# Altium footprint library Molex FFC - FPC Connectors (SMT).PcbLib: 638 footprints (part 23 of 40)
Each footprint in its own frame and in the unit in brackets; x right, y up, seen from the top. Pads: shape width x height; smd on the part's side, far side on the other; paste and mask are expansions set on the pad; w line width, h text height; cw(c..) or ccw(c..) is an arc to the next point about the centre after c.
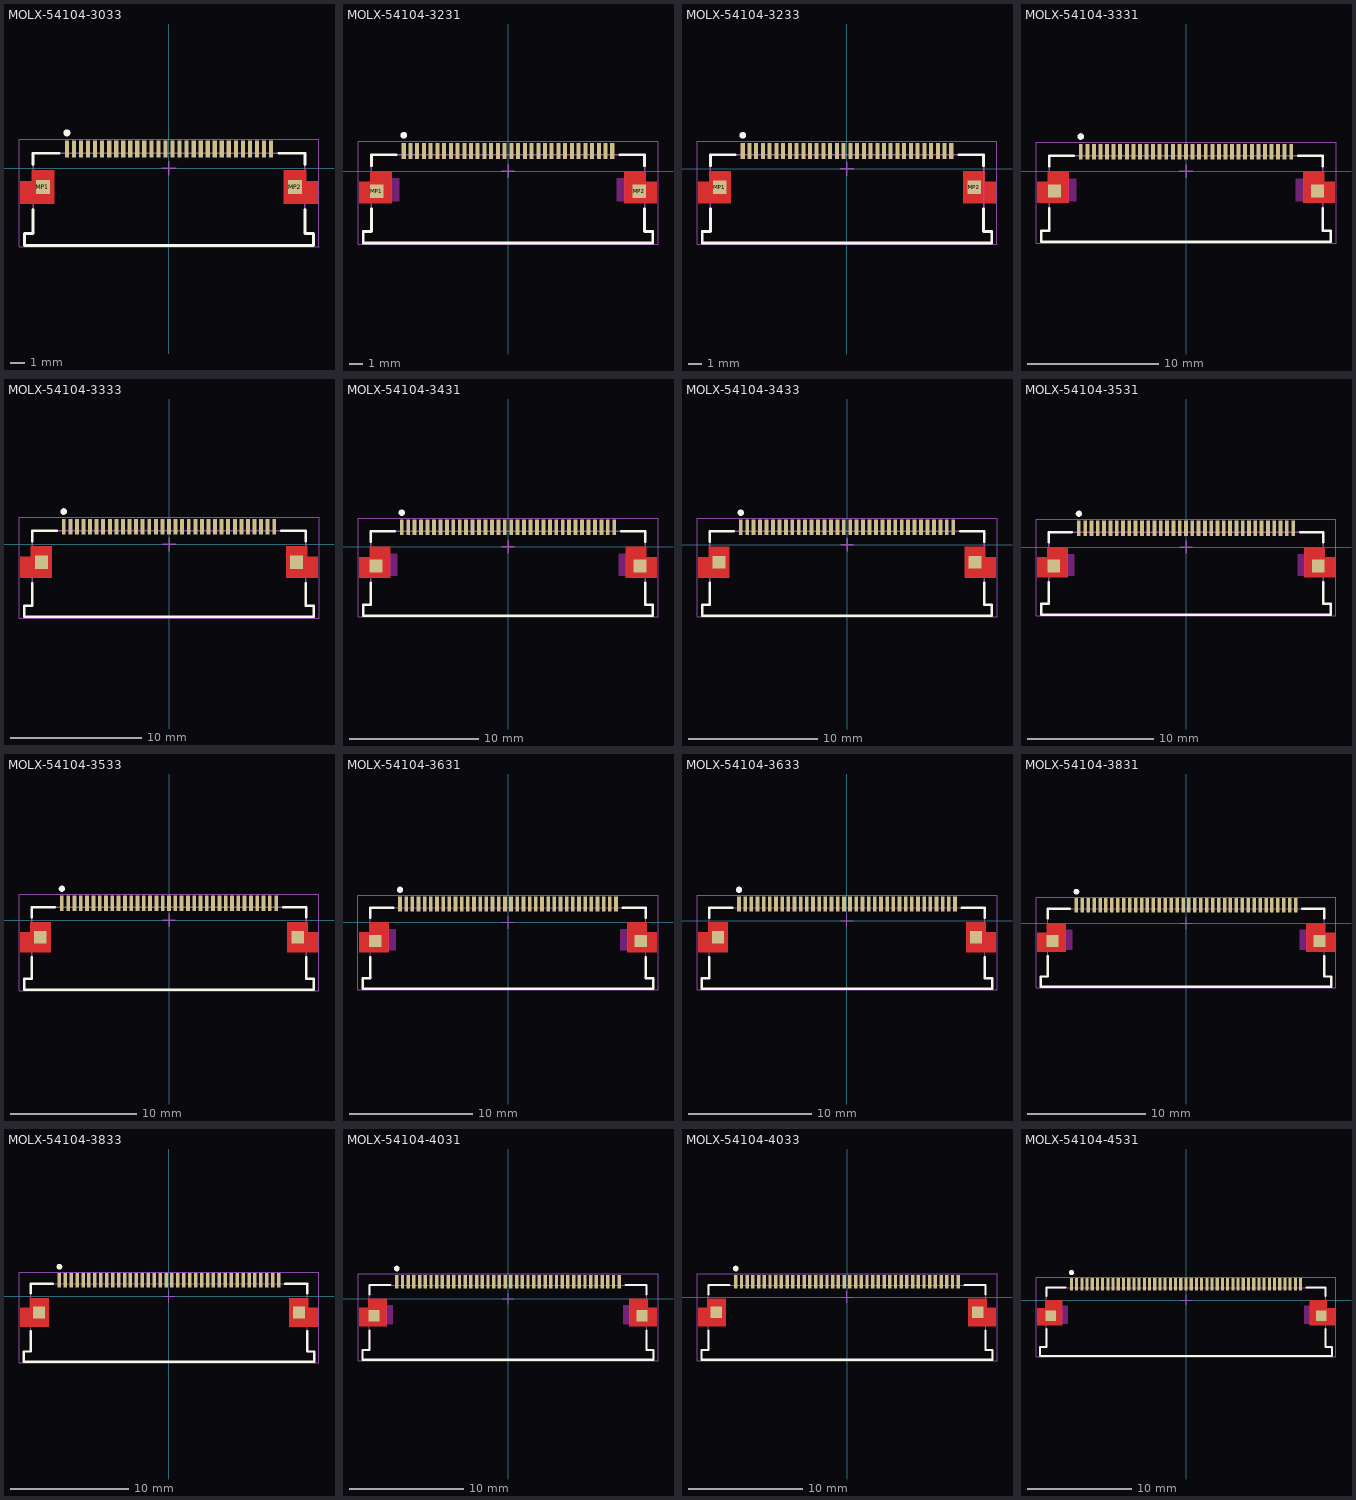
[diagram p22: the footprints below, top view; thin cyan lines are the x and y axes]

## MOLX-54104-3033 [mm] "FPC Connector, 30-Leads, Right Angle, Pitch 0.5 mm, Mated Height 2.0 mm, SMT"
height 2.062
pads (32):
  rect 0.3x1.2 smd: 1(-7.25,1.35) 2(-6.75,1.35) 3(-6.25,1.35) 4(-5.75,1.35) 5(-5.25,1.35) 6(-4.75,1.35) 7(-4.25,1.35) 8(-3.75,1.35) 9(-3.25,1.35) 10(-2.75,1.35) 11(-2.25,1.35) 12(-1.75,1.35) 13(-1.25,1.35) 14(-0.75,1.35) 15(-0.25,1.35) 16(0.25,1.35) 17(0.75,1.35) 18(1.25,1.35) 19(1.75,1.35) 20(2.25,1.35) 21(2.75,1.35) 22(3.25,1.35) 23(3.75,1.35) 24(4.25,1.35) 25(4.75,1.35) 26(5.25,1.35) 27(5.75,1.35) 28(6.25,1.35) 29(6.75,1.35) 30(7.25,1.35)
  rect 1x1 smd mask+0: MP1(-8.95,-1.35) MP2(8.95,-1.35)
Top Layer:
  region: -8.15,-2.55 -8.15,-0.15 -9.75,-0.15 -9.75,-0.95 -10.55,-0.95 -10.55,-2.55
  region: 8.15,-2.55 8.15,-0.15 9.75,-0.15 9.75,-0.95 10.55,-0.95 10.55,-2.55
Top Overlay:
  circle w0.25: c-7.25,2.5 r0.125
  lines w0.2: -9.65,-2.95 -9.65,-4.65 -10.25,-4.65 -10.25,-5.5 10.25,-5.5 10.25,-4.65 ; -9.65,0.25 -9.65,1.05 -7.8,1.05 ; 7.8,1.05 9.65,1.05 9.65,0.25 ; 9.65,-2.95 9.65,-4.65 10.25,-4.65
Mechanical 13:
  lines w0.1: -10.25,-5.5 10.25,-5.5 10.25,-4.65 9.65,-4.65 9.65,1.05 -9.65,1.05 -9.65,-4.65 -10.25,-4.65 -10.25,-5.5 ; -10.25,-5.493 -10.25,-5.493
Mechanical 15:
  lines w0.05: -10.65,-5.6 -10.65,2.05 10.65,2.05 10.65,-5.6 -10.65,-5.6
  lines w0.1: -0.5,0 0.5,0 ; 0,-0.5 0,0.5
3D body: height 0.25, standoff 0, extent -10.25,-5.5 10.25,1.65

## MOLX-54104-3231 [mm] "FPC Connector, 32-Leads, Right Angle, Pitch 0.5 mm, Mated Height 2.0 mm, SMT"
height 2.062
pads (34):
  rect 0.3x1.2 smd: 1(-7.75,1.5) 2(-7.25,1.5) 3(-6.75,1.5) 4(-6.25,1.5) 5(-5.75,1.5) 6(-5.25,1.5) 7(-4.75,1.5) 8(-4.25,1.5) 9(-3.75,1.5) 10(-3.25,1.5) 11(-2.75,1.5) 12(-2.25,1.5) 13(-1.75,1.5) 14(-1.25,1.5) 15(-0.75,1.5) 16(-0.25,1.5) 17(0.25,1.5) 18(0.75,1.5) 19(1.25,1.5) 20(1.75,1.5) 21(2.25,1.5) 22(2.75,1.5) 23(3.25,1.5) 24(3.75,1.5) 25(4.25,1.5) 26(4.75,1.5) 27(5.25,1.5) 28(5.75,1.5) 29(6.25,1.5) 30(6.75,1.5) 31(7.25,1.5) 32(7.75,1.5)
  rect 1x1 smd: MP1(-9.75,-1.5) MP2(9.75,-1.5)
Top Layer:
  region: -8.65,0 -10.25,0 -10.25,-0.8 -11.05,-0.8 -11.05,-2.4 -8.65,-2.4
  region: 8.65,0 10.25,0 10.25,-0.8 11.05,-0.8 11.05,-2.4 8.65,-2.4
Top Overlay:
  circle w0.25: c-7.75,2.65 r0.125
  lines w0.2: -10.75,-5.35 10.75,-5.35 10.75,-4.5 10.15,-4.5 10.15,-2.8 ; -10.75,-5.35 -10.75,-4.5 -10.15,-4.5 -10.15,-2.8 ; -10.15,0.4 -10.15,1.2 -8.3,1.2 ; 8.3,1.2 10.15,1.2 10.15,0.4
Keep-Out Layer:
  region: -8.1,-0.55 -8.65,-0.55 -8.65,-2.25 -8.1,-2.25
  region: 8.65,-0.55 8.1,-0.55 8.1,-2.25 8.65,-2.25
Mechanical 13:
  lines w0.1: -10.75,-5.35 10.75,-5.35 10.75,-4.5 10.15,-4.5 10.15,1.2 -10.15,1.2 -10.15,-4.5 -10.75,-4.5 -10.75,-5.35
Mechanical 15:
  lines w0.05: -11.15,-5.45 -11.15,2.2 11.15,2.2 11.15,-5.45 -11.15,-5.45
  lines w0.1: -0.5,0 0.5,0 ; 0,-0.5 0,0.5
3D body: height 0.25, standoff 0, extent -10.75,-5.35 10.75,1.8

## MOLX-54104-3233 [mm] "FPC Connector, 32-Leads, Right Angle, Pitch 0.5 mm, Mated Height 2.0 mm, SMT"
height 2.062
pads (34):
  rect 0.3x1.2 smd: 1(-7.75,1.35) 2(-7.25,1.35) 3(-6.75,1.35) 4(-6.25,1.35) 5(-5.75,1.35) 6(-5.25,1.35) 7(-4.75,1.35) 8(-4.25,1.35) 9(-3.75,1.35) 10(-3.25,1.35) 11(-2.75,1.35) 12(-2.25,1.35) 13(-1.75,1.35) 14(-1.25,1.35) 15(-0.75,1.35) 16(-0.25,1.35) 17(0.25,1.35) 18(0.75,1.35) 19(1.25,1.35) 20(1.75,1.35) 21(2.25,1.35) 22(2.75,1.35) 23(3.25,1.35) 24(3.75,1.35) 25(4.25,1.35) 26(4.75,1.35) 27(5.25,1.35) 28(5.75,1.35) 29(6.25,1.35) 30(6.75,1.35) 31(7.25,1.35) 32(7.75,1.35)
  rect 1x1 smd mask+0: MP1(-9.45,-1.35) MP2(9.45,-1.35)
Top Layer:
  region: 8.65,-2.55 8.65,-0.15 10.25,-0.15 10.25,-0.95 11.05,-0.95 11.05,-2.55
  region: -8.65,-2.55 -8.65,-0.15 -10.25,-0.15 -10.25,-0.95 -11.05,-0.95 -11.05,-2.55
Top Overlay:
  circle w0.25: c-7.75,2.5 r0.125
  lines w0.2: -10.15,-2.95 -10.15,-4.65 -10.75,-4.65 -10.75,-5.5 10.75,-5.5 10.75,-4.65 10.15,-4.65 10.15,-2.95 ; -10.15,0.25 -10.15,1.05 -8.3,1.05 ; 8.3,1.05 10.15,1.05 10.15,0.25
Mechanical 13:
  lines w0.1: 10.15,-4.65 10.75,-4.65 ; 10.75,-4.65 10.75,-5.5 -10.75,-5.5 -10.75,-4.65 -10.15,-4.65 -10.15,1.05 10.15,1.05 ; 10.15,1.05 10.15,1.05
Mechanical 13 keep-out:
  lines w0.1: 10.15,-4.65 10.15,1.05
Mechanical 15:
  lines w0.05: -11.15,-5.6 11.15,-5.6 11.15,2.05 -11.15,2.05 -11.15,-5.6
  lines w0.1: -0.5,0 0.5,0 ; 0,-0.5 0,0.5
3D body: height 0.25, standoff 0, extent -10.75,-5.5 10.75,1.65

## MOLX-54104-3331 [mm] "FPC Connector, 33-Leads, Right Angle, Pitch 0.5 mm, Mated Height 2.0 mm, SMT"
height 2.062
pads (35):
  rect 0.3x1.2 smd: 1(-8,1.5) 2(-7.5,1.5) 3(-7,1.5) 4(-6.5,1.5) 5(-6,1.5) 6(-5.5,1.5) 7(-5,1.5) 8(-4.5,1.5) 9(-4,1.5) 10(-3.5,1.5) 11(-3,1.5) 12(-2.5,1.5) 13(-2,1.5) 14(-1.5,1.5) 15(-1,1.5) 16(-0.5,1.5) 17(0,1.5) 18(0.5,1.5) 19(1,1.5) 20(1.5,1.5) 21(2,1.5) 22(2.5,1.5) 23(3,1.5) 24(3.5,1.5) 25(4,1.5) 26(4.5,1.5) 27(5,1.5) 28(5.5,1.5) 29(6,1.5) 30(6.5,1.5) 31(7,1.5) 32(7.5,1.5) 33(8,1.5)
  rect 1x1 smd: MP1(-10,-1.5) MP2(10,-1.5)
Top Layer:
  region: -8.9,0 -10.5,0 -10.5,-0.8 -11.3,-0.8 -11.3,-2.4 -8.9,-2.4
  region: 8.9,0 10.5,0 10.5,-0.8 11.3,-0.8 11.3,-2.4 8.9,-2.4
Top Overlay:
  circle w0.25: c-8,2.65 r0.125
  lines w0.2: -11,-5.35 11,-5.35 11,-4.5 10.4,-4.5 10.4,-2.8 ; -11,-5.35 -11,-4.5 -10.4,-4.5 -10.4,-2.8 ; -10.4,0.4 -10.4,1.2 -8.55,1.2 ; 8.55,1.2 10.4,1.2 10.4,0.4
Keep-Out Layer:
  region: -8.35,-0.55 -8.9,-0.55 -8.9,-2.25 -8.35,-2.25
  region: 8.9,-0.55 8.35,-0.55 8.35,-2.25 8.9,-2.25
Mechanical 13:
  lines w0.1: -11,-5.35 11,-5.35 11,-4.5 10.4,-4.5 10.4,1.2 -10.4,1.2 -10.4,-4.5 -11,-4.5 -11,-5.35
Mechanical 15:
  lines w0.05: -11.4,-5.45 -11.4,2.2 11.4,2.2 11.4,-5.45 -11.4,-5.45
  lines w0.1: -0.5,0 0.5,0 ; 0,-0.5 0,0.5
3D body: height 0.25, standoff 0, extent -11,-5.35 11,1.8

## MOLX-54104-3333 [mm] "FPC Connector, 33-Leads, Right Angle, Pitch 0.5 mm, Mated Height 2.0 mm, SMT"
height 2.062
pads (35):
  rect 0.3x1.2 smd: 1(-8,1.35) 2(-7.5,1.35) 3(-7,1.35) 4(-6.5,1.35) 5(-6,1.35) 6(-5.5,1.35) 7(-5,1.35) 8(-4.5,1.35) 9(-4,1.35) 10(-3.5,1.35) 11(-3,1.35) 12(-2.5,1.35) 13(-2,1.35) 14(-1.5,1.35) 15(-1,1.35) 16(-0.5,1.35) 17(0,1.35) 18(0.5,1.35) 19(1,1.35) 20(1.5,1.35) 21(2,1.35) 22(2.5,1.35) 23(3,1.35) 24(3.5,1.35) 25(4,1.35) 26(4.5,1.35) 27(5,1.35) 28(5.5,1.35) 29(6,1.35) 30(6.5,1.35) 31(7,1.35) 32(7.5,1.35) 33(8,1.35)
  rect 1x1 smd mask+0: MP1(-9.7,-1.35) MP2(9.7,-1.35)
Top Layer:
  region: 8.9,-2.55 8.9,-0.15 10.5,-0.15 10.5,-0.95 11.3,-0.95 11.3,-2.55
  region: -8.9,-2.55 -8.9,-0.15 -10.5,-0.15 -10.5,-0.95 -11.3,-0.95 -11.3,-2.55
Top Overlay:
  circle w0.25: c-8,2.5 r0.125
  lines w0.2: -10.4,-2.95 -10.4,-4.65 -11,-4.65 -11,-5.5 11,-5.5 11,-4.65 10.4,-4.65 10.4,-2.95 ; -10.4,0.25 -10.4,1.05 -8.55,1.05 ; 8.55,1.05 10.4,1.05 10.4,0.25
Mechanical 13:
  lines w0.1: -11,-5.5 11,-5.5 11,-4.65 10.4,-4.65 10.4,1.05 -10.4,1.05 -10.4,-4.65 -11,-4.65 -11,-5.5
Mechanical 15:
  lines w0.05: -11.4,-5.6 11.4,-5.6 11.4,2.05 -11.4,2.05 -11.4,-5.6
  lines w0.1: -0.5,0 0.5,0 ; 0,-0.5 0,0.5
3D body: height 0.25, standoff 0, extent -11,-5.5 11,1.65

## MOLX-54104-3431 [mm] "FPC Connector, 34-Leads, Right Angle, Pitch 0.5 mm, Mated Height 2.0 mm, SMT"
height 2.062
pads (36):
  rect 0.3x1.2 smd: 1(-8.25,1.5) 2(-7.75,1.5) 3(-7.25,1.5) 4(-6.75,1.5) 5(-6.25,1.5) 6(-5.75,1.5) 7(-5.25,1.5) 8(-4.75,1.5) 9(-4.25,1.5) 10(-3.75,1.5) 11(-3.25,1.5) 12(-2.75,1.5) 13(-2.25,1.5) 14(-1.75,1.5) 15(-1.25,1.5) 16(-0.75,1.5) 17(-0.25,1.5) 18(0.25,1.5) 19(0.75,1.5) 20(1.25,1.5) 21(1.75,1.5) 22(2.25,1.5) 23(2.75,1.5) 24(3.25,1.5) 25(3.75,1.5) 26(4.25,1.5) 27(4.75,1.5) 28(5.25,1.5) 29(5.75,1.5) 30(6.25,1.5) 31(6.75,1.5) 32(7.25,1.5) 33(7.75,1.5) 34(8.25,1.5)
  rect 1x1 smd: MP1(-10.25,-1.5) MP2(10.25,-1.5)
Top Layer:
  region: -9.15,0 -10.75,0 -10.75,-0.8 -11.55,-0.8 -11.55,-2.4 -9.15,-2.4
  region: 9.15,0 10.75,0 10.75,-0.8 11.55,-0.8 11.55,-2.4 9.15,-2.4
Top Overlay:
  circle w0.25: c-8.25,2.65 r0.125
  lines w0.2: -11.25,-5.35 11.25,-5.35 11.25,-4.5 10.65,-4.5 10.65,-2.8 ; -11.25,-5.35 -11.25,-4.5 -10.65,-4.5 -10.65,-2.8 ; -10.65,0.4 -10.65,1.2 -8.8,1.2 ; 8.8,1.2 10.65,1.2 10.65,0.4
Keep-Out Layer:
  region: -8.6,-0.55 -9.15,-0.55 -9.15,-2.25 -8.6,-2.25
  region: 9.15,-0.55 8.6,-0.55 8.6,-2.25 9.15,-2.25
Mechanical 13:
  lines w0.1: -11.25,-5.35 11.25,-5.35 11.25,-4.5 10.65,-4.5 10.65,1.2 -10.65,1.2 -10.65,-4.5 -11.25,-4.5 -11.25,-5.35
Mechanical 15:
  lines w0.05: -11.65,-5.45 -11.65,2.2 11.65,2.2 11.65,-5.45 -11.65,-5.45
  lines w0.1: -0.5,0 0.5,0 ; 0,-0.5 0,0.5
3D body: height 0.25, standoff 0, extent -11.25,-5.35 11.25,1.8

## MOLX-54104-3433 [mm] "FPC Connector, 34-Leads, Right Angle, Pitch 0.5 mm, Mated Height 2.0 mm, SMT"
height 2.062
pads (36):
  rect 0.3x1.2 smd: 1(-8.25,1.35) 2(-7.75,1.35) 3(-7.25,1.35) 4(-6.75,1.35) 5(-6.25,1.35) 6(-5.75,1.35) 7(-5.25,1.35) 8(-4.75,1.35) 9(-4.25,1.35) 10(-3.75,1.35) 11(-3.25,1.35) 12(-2.75,1.35) 13(-2.25,1.35) 14(-1.75,1.35) 15(-1.25,1.35) 16(-0.75,1.35) 17(-0.25,1.35) 18(0.25,1.35) 19(0.75,1.35) 20(1.25,1.35) 21(1.75,1.35) 22(2.25,1.35) 23(2.75,1.35) 24(3.25,1.35) 25(3.75,1.35) 26(4.25,1.35) 27(4.75,1.35) 28(5.25,1.35) 29(5.75,1.35) 30(6.25,1.35) 31(6.75,1.35) 32(7.25,1.35) 33(7.75,1.35) 34(8.25,1.35)
  rect 1x1 smd mask+0: MP1(-9.95,-1.35) MP2(9.95,-1.35)
Top Layer:
  region: -9.15,-2.55 -9.15,-0.15 -10.75,-0.15 -10.75,-0.95 -11.55,-0.95 -11.55,-2.55
  region: 9.15,-2.55 9.15,-0.15 10.75,-0.15 10.75,-0.95 11.55,-0.95 11.55,-2.55
Top Overlay:
  circle w0.25: c-8.25,2.5 r0.125
  lines w0.2: -10.65,-2.95 -10.65,-4.65 -11.25,-4.65 -11.25,-5.5 11.25,-5.5 11.25,-4.65 10.65,-4.65 10.65,-2.95 ; -10.65,0.25 -10.65,1.05 -8.8,1.05 ; 8.8,1.05 10.65,1.05 10.65,0.25
Mechanical 13:
  lines w0.1: -11.25,-5.5 -11.25,-4.65 -10.65,-4.65 -10.65,1.05 10.65,1.05 10.65,-4.65 11.25,-4.65 11.25,-5.5 -11.25,-5.5
Mechanical 15:
  lines w0.05: -11.65,-5.6 -11.65,2.05 11.65,2.05 11.65,-5.6 -11.65,-5.6
  lines w0.1: -0.5,0 0.5,0 ; 0,-0.5 0,0.5
3D body: height 0.25, standoff 0, extent -11.249,-5.5 11.25,1.65

## MOLX-54104-3531 [mm] "FPC Connector, 35-Leads, Right Angle, Pitch 0.5 mm, Mated Height 2.0 mm, SMT"
height 2.062
pads (37):
  rect 0.3x1.2 smd: 1(-8.5,1.5) 2(-8,1.5) 3(-7.5,1.5) 4(-7,1.5) 5(-6.5,1.5) 6(-6,1.5) 7(-5.5,1.5) 8(-5,1.5) 9(-4.5,1.5) 10(-4,1.5) 11(-3.5,1.5) 12(-3,1.5) 13(-2.5,1.5) 14(-2,1.5) 15(-1.5,1.5) 16(-1,1.5) 17(-0.5,1.5) 18(0,1.5) 19(0.5,1.5) 20(1,1.5) 21(1.5,1.5) 22(2,1.5) 23(2.5,1.5) 24(3,1.5) 25(3.5,1.5) 26(4,1.5) 27(4.5,1.5) 28(5,1.5) 29(5.5,1.5) 30(6,1.5) 31(6.5,1.5) 32(7,1.5) 33(7.5,1.5) 34(8,1.5) 35(8.5,1.5)
  rect 1x1 smd: MP1(-10.5,-1.5) MP2(10.5,-1.5)
Top Layer:
  region: 9.4,0 11,0 11,-0.8 11.8,-0.8 11.8,-2.4 9.4,-2.4
  region: -9.4,0 -11,0 -11,-0.8 -11.8,-0.8 -11.8,-2.4 -9.4,-2.4
Top Overlay:
  circle w0.25: c-8.5,2.65 r0.125
  lines w0.2: -11.5,-5.35 11.5,-5.35 11.5,-4.5 10.9,-4.5 10.9,-2.8 ; -11.5,-5.35 -11.5,-4.5 -10.9,-4.5 -10.9,-2.8 ; -10.9,0.4 -10.9,1.2 -9.05,1.2 ; 9.05,1.2 10.9,1.2 10.9,0.4
Keep-Out Layer:
  region: 9.4,-0.55 8.85,-0.55 8.85,-2.25 9.4,-2.25
  region: -8.85,-0.55 -9.4,-0.55 -9.4,-2.25 -8.85,-2.25
Mechanical 13:
  lines w0.1: -11.5,-5.35 -11.5,-4.5 -10.9,-4.5 -10.9,1.2 10.9,1.2 10.9,-4.5 11.5,-4.5 11.5,-5.35 -11.5,-5.35
Mechanical 15:
  lines w0.05: -11.9,-5.45 11.9,-5.45 11.9,2.2 -11.9,2.2 -11.9,-5.45
  lines w0.1: -0.5,0 0.5,0 ; 0,-0.5 0,0.5
3D body: height 0.25, standoff 0, extent -11.5,-5.35 11.5,1.8

## MOLX-54104-3533 [mm] "FPC Connector, 35-Leads, Right Angle, Pitch 0.5 mm, Mated Height 2.0 mm, SMT"
height 2.062
pads (37):
  rect 0.3x1.2 smd: 1(-8.5,1.35) 2(-8,1.35) 3(-7.5,1.35) 4(-7,1.35) 5(-6.5,1.35) 6(-6,1.35) 7(-5.5,1.35) 8(-5,1.35) 9(-4.5,1.35) 10(-4,1.35) 11(-3.5,1.35) 12(-3,1.35) 13(-2.5,1.35) 14(-2,1.35) 15(-1.5,1.35) 16(-1,1.35) 17(-0.5,1.35) 18(0,1.35) 19(0.5,1.35) 20(1,1.35) 21(1.5,1.35) 22(2,1.35) 23(2.5,1.35) 24(3,1.35) 25(3.5,1.35) 26(4,1.35) 27(4.5,1.35) 28(5,1.35) 29(5.5,1.35) 30(6,1.35) 31(6.5,1.35) 32(7,1.35) 33(7.5,1.35) 34(8,1.35) 35(8.5,1.35)
  rect 1x1 smd mask+0: MP1(-10.2,-1.35) MP2(10.2,-1.35)
Top Layer:
  region: 9.4,-2.55 9.4,-0.15 11,-0.15 11,-0.95 11.8,-0.95 11.8,-2.55
  region: -9.4,-2.55 -9.4,-0.15 -11,-0.15 -11,-0.95 -11.8,-0.95 -11.8,-2.55
Top Overlay:
  circle w0.25: c-8.5,2.5 r0.125
  lines w0.2: -10.9,-2.95 -10.9,-4.65 -11.5,-4.65 -11.5,-5.5 11.5,-5.5 11.5,-4.65 10.9,-4.65 10.9,-2.95 ; -10.9,0.25 -10.9,1.05 -9.05,1.05 ; 9.05,1.05 10.9,1.05 10.9,0.25
Mechanical 13:
  lines w0.1: -11.5,-5.5 -11.5,-4.65 -10.9,-4.65 -10.9,1.05 10.9,1.05 10.9,-4.65 11.5,-4.65 11.5,-5.5 -11.5,-5.5
Mechanical 15:
  lines w0.05: -11.9,-5.6 11.9,-5.6 11.9,2.05 -11.9,2.05 -11.9,-5.6
  lines w0.1: -0.5,0 0.5,0 ; 0,-0.5 0,0.5
3D body: height 0.25, standoff 0, extent -11.5,-5.5 11.5,1.65

## MOLX-54104-3631 [mm] "FPC Connector, 36-Leads, Right Angle, Pitch 0.5 mm, Mated Height 2.0 mm, SMT"
height 2.062
pads (38):
  rect 0.3x1.2 smd: 1(-8.75,1.5) 2(-8.25,1.5) 3(-7.75,1.5) 4(-7.25,1.5) 5(-6.75,1.5) 6(-6.25,1.5) 7(-5.75,1.5) 8(-5.25,1.5) 9(-4.75,1.5) 10(-4.25,1.5) 11(-3.75,1.5) 12(-3.25,1.5) 13(-2.75,1.5) 14(-2.25,1.5) 15(-1.75,1.5) 16(-1.25,1.5) 17(-0.75,1.5) 18(-0.25,1.5) 19(0.25,1.5) 20(0.75,1.5) 21(1.25,1.5) 22(1.75,1.5) 23(2.25,1.5) 24(2.75,1.5) 25(3.25,1.5) 26(3.75,1.5) 27(4.25,1.5) 28(4.75,1.5) 29(5.25,1.5) 30(5.75,1.5) 31(6.25,1.5) 32(6.75,1.5) 33(7.25,1.5) 34(7.75,1.5) 35(8.25,1.5) 36(8.75,1.5)
  rect 1x1 smd: MP1(-10.75,-1.5) MP2(10.75,-1.5)
Top Layer:
  region: 9.65,0 11.25,0 11.25,-0.8 12.05,-0.8 12.05,-2.4 9.65,-2.4
  region: -9.65,0 -11.25,0 -11.25,-0.8 -12.05,-0.8 -12.05,-2.4 -9.65,-2.4
Top Overlay:
  circle w0.25: c-8.75,2.65 r0.125
  lines w0.2: -11.75,-5.35 11.75,-5.35 11.75,-4.5 11.15,-4.5 11.15,-2.8 ; -11.75,-5.35 -11.75,-4.5 -11.15,-4.5 -11.15,-2.8 ; -11.15,0.4 -11.15,1.2 -9.3,1.2 ; 9.3,1.2 11.15,1.2 11.15,0.4
Keep-Out Layer:
  region: 9.65,-0.55 9.1,-0.55 9.1,-2.25 9.65,-2.25
  region: -9.1,-0.55 -9.65,-0.55 -9.65,-2.25 -9.1,-2.25
Mechanical 13:
  lines w0.1: -11.75,-5.35 -11.75,-4.5 -11.15,-4.5 -11.15,1.2 11.15,1.2 11.15,-4.5 11.75,-4.5 11.75,-5.35 -11.75,-5.35
Mechanical 15:
  lines w0.05: -12.15,-5.45 12.15,-5.45 12.15,2.2 -12.15,2.2 -12.15,-5.45
  lines w0.1: -0.5,0 0.5,0 ; 0,-0.5 0,0.5
3D body: height 0.25, standoff 0, extent -11.75,-5.35 11.75,1.8

## MOLX-54104-3633 [mm] "FPC Connector, 36-Leads, Right Angle, Pitch 0.5 mm, Mated Height 2.0 mm, SMT"
height 2.062
pads (38):
  rect 0.3x1.2 smd: 1(-8.75,1.35) 2(-8.25,1.35) 3(-7.75,1.35) 4(-7.25,1.35) 5(-6.75,1.35) 6(-6.25,1.35) 7(-5.75,1.35) 8(-5.25,1.35) 9(-4.75,1.35) 10(-4.25,1.35) 11(-3.75,1.35) 12(-3.25,1.35) 13(-2.75,1.35) 14(-2.25,1.35) 15(-1.75,1.35) 16(-1.25,1.35) 17(-0.75,1.35) 18(-0.25,1.35) 19(0.25,1.35) 20(0.75,1.35) 21(1.25,1.35) 22(1.75,1.35) 23(2.25,1.35) 24(2.75,1.35) 25(3.25,1.35) 26(3.75,1.35) 27(4.25,1.35) 28(4.75,1.35) 29(5.25,1.35) 30(5.75,1.35) 31(6.25,1.35) 32(6.75,1.35) 33(7.25,1.35) 34(7.75,1.35) 35(8.25,1.35) 36(8.75,1.35)
  rect 1x1 smd mask+0: MP1(-10.45,-1.35) MP2(10.45,-1.35)
Top Layer:
  region: -9.65,-2.55 -9.65,-0.15 -11.25,-0.15 -11.25,-0.95 -12.05,-0.95 -12.05,-2.55
  region: 9.65,-2.55 9.65,-0.15 11.25,-0.15 11.25,-0.95 12.05,-0.95 12.05,-2.55
Top Overlay:
  circle w0.25: c-8.75,2.5 r0.125
  lines w0.2: -11.15,-2.95 -11.15,-4.65 -11.75,-4.65 -11.75,-5.5 11.75,-5.5 11.75,-4.65 11.15,-4.65 11.15,-2.95 ; -11.15,0.25 -11.15,1.05 -9.3,1.05 ; 9.3,1.05 11.15,1.05 11.15,0.25
Mechanical 13:
  lines w0.1: -11.75,-5.5 -11.75,-4.65 -11.15,-4.65 -11.15,1.05 11.15,1.05 11.15,-4.65 11.75,-4.65 11.75,-5.5 -11.75,-5.5
Mechanical 15:
  lines w0.05: -12.15,-5.6 -12.15,2.05 12.15,2.05 12.15,-5.6 -12.15,-5.6
  lines w0.1: -0.5,0 0.5,0 ; 0,-0.5 0,0.5
3D body: height 0.25, standoff 0, extent -11.75,-5.5 11.75,1.65

## MOLX-54104-3831 [mm] "FPC Connector, 38-Leads, Right Angle, Pitch 0.5 mm, Mated Height 2.0 mm, SMT"
height 2.062
pads (40):
  rect 0.3x1.2 smd: 1(-9.25,1.5) 2(-8.75,1.5) 3(-8.25,1.5) 4(-7.75,1.5) 5(-7.25,1.5) 6(-6.75,1.5) 7(-6.25,1.5) 8(-5.75,1.5) 9(-5.25,1.5) 10(-4.75,1.5) 11(-4.25,1.5) 12(-3.75,1.5) 13(-3.25,1.5) 14(-2.75,1.5) 15(-2.25,1.5) 16(-1.75,1.5) 17(-1.25,1.5) 18(-0.75,1.5) 19(-0.25,1.5) 20(0.25,1.5) 21(0.75,1.5) 22(1.25,1.5) 23(1.75,1.5) 24(2.25,1.5) 25(2.75,1.5) 26(3.25,1.5) 27(3.75,1.5) 28(4.25,1.5) 29(4.75,1.5) 30(5.25,1.5) 31(5.75,1.5) 32(6.25,1.5) 33(6.75,1.5) 34(7.25,1.5) 35(7.75,1.5) 36(8.25,1.5) 37(8.75,1.5) 38(9.25,1.5)
  rect 1x1 smd: MP1(-11.25,-1.5) MP2(11.25,-1.5)
Top Layer:
  region: -10.15,0 -11.75,0 -11.75,-0.8 -12.55,-0.8 -12.55,-2.4 -10.15,-2.4
  region: 10.15,0 11.75,0 11.75,-0.8 12.55,-0.8 12.55,-2.4 10.15,-2.4
Top Overlay:
  circle w0.25: c-9.25,2.65 r0.125
  lines w0.2: -12.25,-5.35 12.25,-5.35 12.25,-4.5 11.65,-4.5 11.65,-2.8 ; -12.25,-5.35 -12.25,-4.5 -11.65,-4.5 -11.65,-2.8 ; -11.65,0.4 -11.65,1.2 -9.8,1.2 ; 9.8,1.2 11.65,1.2 11.65,0.4
Keep-Out Layer:
  region: -9.6,-0.55 -10.15,-0.55 -10.15,-2.25 -9.6,-2.25
  region: 10.15,-0.55 9.6,-0.55 9.6,-2.25 10.15,-2.25
Mechanical 13:
  lines w0.1: -12.25,-5.35 12.25,-5.35 12.25,-4.5 11.65,-4.5 11.65,1.2 -11.65,1.2 -11.65,-4.5 -12.25,-4.5 -12.25,-5.35
Mechanical 15:
  lines w0.05: -12.65,-5.45 -12.65,2.2 12.65,2.2 12.65,-5.45 -12.65,-5.45
  lines w0.1: -0.5,0 0.5,0 ; 0,-0.5 0,0.5
3D body: height 0.25, standoff 0, extent -12.25,-5.35 12.25,1.8

## MOLX-54104-3833 [mm] "FPC Connector, 38-Leads, Right Angle, Pitch 0.5 mm, Mated Height 2.0 mm, SMT"
height 2.062
pads (40):
  rect 0.3x1.2 smd: 1(-9.25,1.35) 2(-8.75,1.35) 3(-8.25,1.35) 4(-7.75,1.35) 5(-7.25,1.35) 6(-6.75,1.35) 7(-6.25,1.35) 8(-5.75,1.35) 9(-5.25,1.35) 10(-4.75,1.35) 11(-4.25,1.35) 12(-3.75,1.35) 13(-3.25,1.35) 14(-2.75,1.35) 15(-2.25,1.35) 16(-1.75,1.35) 17(-1.25,1.35) 18(-0.75,1.35) 19(-0.25,1.35) 20(0.25,1.35) 21(0.75,1.35) 22(1.25,1.35) 23(1.75,1.35) 24(2.25,1.35) 25(2.75,1.35) 26(3.25,1.35) 27(3.75,1.35) 28(4.25,1.35) 29(4.75,1.35) 30(5.25,1.35) 31(5.75,1.35) 32(6.25,1.35) 33(6.75,1.35) 34(7.25,1.35) 35(7.75,1.35) 36(8.25,1.35) 37(8.75,1.35) 38(9.25,1.35)
  rect 1x1 smd mask+0: MP1(-10.95,-1.35) MP2(10.95,-1.35)
Top Layer:
  region: -10.15,-2.55 -10.15,-0.15 -11.75,-0.15 -11.75,-0.95 -12.55,-0.95 -12.55,-2.55
  region: 10.15,-2.55 10.15,-0.15 11.75,-0.15 11.75,-0.95 12.55,-0.95 12.55,-2.55
Top Overlay:
  circle w0.25: c-9.25,2.5 r0.125
  lines w0.2: -11.65,-2.95 -11.65,-4.65 -12.25,-4.65 -12.25,-5.5 12.25,-5.5 12.25,-4.65 11.65,-4.65 11.65,-2.95 ; -11.65,0.25 -11.65,1.05 -9.8,1.05 ; 9.8,1.05 11.65,1.05 11.65,0.25
Mechanical 13:
  lines w0.1: -12.25,-5.5 -12.25,-4.65 -11.65,-4.65 -11.65,1.05 11.65,1.05 11.65,-4.65 12.25,-4.65 12.25,-5.5 -12.25,-5.5
Mechanical 15:
  lines w0.05: -12.65,-5.6 -12.65,2.05 12.65,2.05 12.65,-5.6 -12.65,-5.6
  lines w0.1: -0.5,0 0.5,0 ; 0,-0.5 0,0.5
3D body: height 0.25, standoff 0, extent -12.25,-5.5 12.25,1.65

## MOLX-54104-4031 [mm] "FPC Connector, 40-Leads, Right Angle, Pitch 0.5 mm, Mated Height 2.0 mm, SMT"
height 2.062
pads (42):
  rect 0.3x1.2 smd: 1(-9.75,1.5) 2(-9.25,1.5) 3(-8.75,1.5) 4(-8.25,1.5) 5(-7.75,1.5) 6(-7.25,1.5) 7(-6.75,1.5) 8(-6.25,1.5) 9(-5.75,1.5) 10(-5.25,1.5) 11(-4.75,1.5) 12(-4.25,1.5) 13(-3.75,1.5) 14(-3.25,1.5) 15(-2.75,1.5) 16(-2.25,1.5) 17(-1.75,1.5) 18(-1.25,1.5) 19(-0.75,1.5) 20(-0.25,1.5) 21(0.25,1.5) 22(0.75,1.5) 23(1.25,1.5) 24(1.75,1.5) 25(2.25,1.5) 26(2.75,1.5) 27(3.25,1.5) 28(3.75,1.5) 29(4.25,1.5) 30(4.75,1.5) 31(5.25,1.5) 32(5.75,1.5) 33(6.25,1.5) 34(6.75,1.5) 35(7.25,1.5) 36(7.75,1.5) 37(8.25,1.5) 38(8.75,1.5) 39(9.25,1.5) 40(9.75,1.5)
  rect 1x1 smd: MP1(-11.75,-1.5) MP2(11.75,-1.5)
Top Layer:
  region: -10.65,0 -12.25,0 -12.25,-0.8 -13.05,-0.8 -13.05,-2.4 -10.65,-2.4
  region: 10.65,0 12.25,0 12.25,-0.8 13.05,-0.8 13.05,-2.4 10.65,-2.4
Top Overlay:
  circle w0.25: c-9.75,2.65 r0.125
  lines w0.2: -12.75,-5.35 12.75,-5.35 12.75,-4.5 12.15,-4.5 12.15,-2.8 ; -12.75,-5.35 -12.75,-4.5 -12.15,-4.5 -12.15,-2.8 ; -12.15,0.4 -12.15,1.2 -10.3,1.2 ; 10.3,1.2 12.15,1.2 12.15,0.4
Keep-Out Layer:
  region: -10.1,-0.55 -10.65,-0.55 -10.65,-2.25 -10.1,-2.25
  region: 10.65,-0.55 10.1,-0.55 10.1,-2.25 10.65,-2.25
Mechanical 13:
  lines w0.1: -12.75,-5.35 12.75,-5.35 12.75,-4.5 12.15,-4.5 12.15,1.2 -12.15,1.2 -12.15,-4.5 -12.75,-4.5 -12.75,-5.35
Mechanical 15:
  lines w0.05: -13.15,-5.45 -13.15,2.2 13.15,2.2 13.15,-5.45 -13.15,-5.45
  lines w0.1: -0.5,0 0.5,0 ; 0,-0.5 0,0.5
3D body: height 0.25, standoff 0, extent -12.75,-5.35 12.75,1.8

## MOLX-54104-4033 [mm] "FPC Connector, 40-Leads, Right Angle, Pitch 0.5 mm, Mated Height 2.0 mm, SMT"
height 2.062
pads (42):
  rect 0.3x1.2 smd: 1(-9.75,1.35) 2(-9.25,1.35) 3(-8.75,1.35) 4(-8.25,1.35) 5(-7.75,1.35) 6(-7.25,1.35) 7(-6.75,1.35) 8(-6.25,1.35) 9(-5.75,1.35) 10(-5.25,1.35) 11(-4.75,1.35) 12(-4.25,1.35) 13(-3.75,1.35) 14(-3.25,1.35) 15(-2.75,1.35) 16(-2.25,1.35) 17(-1.75,1.35) 18(-1.25,1.35) 19(-0.75,1.35) 20(-0.25,1.35) 21(0.25,1.35) 22(0.75,1.35) 23(1.25,1.35) 24(1.75,1.35) 25(2.25,1.35) 26(2.75,1.35) 27(3.25,1.35) 28(3.75,1.35) 29(4.25,1.35) 30(4.75,1.35) 31(5.25,1.35) 32(5.75,1.35) 33(6.25,1.35) 34(6.75,1.35) 35(7.25,1.35) 36(7.75,1.35) 37(8.25,1.35) 38(8.75,1.35) 39(9.25,1.35) 40(9.75,1.35)
  rect 1x1 smd mask+0: MP1(-11.45,-1.35) MP2(11.45,-1.35)
Top Layer:
  region: 10.65,-2.55 10.65,-0.15 12.25,-0.15 12.25,-0.95 13.05,-0.95 13.05,-2.55
  region: -10.65,-2.55 -10.65,-0.15 -12.25,-0.15 -12.25,-0.95 -13.05,-0.95 -13.05,-2.55
Top Overlay:
  circle w0.25: c-9.75,2.5 r0.125
  lines w0.2: -12.15,-2.95 -12.15,-4.65 -12.75,-4.65 -12.75,-5.5 12.75,-5.5 12.75,-4.65 12.15,-4.65 12.15,-2.95 ; -12.15,0.25 -12.15,1.05 -10.3,1.05 ; 10.3,1.05 12.15,1.05 12.15,0.25
Mechanical 13:
  lines w0.1: -12.75,-5.5 12.75,-5.5 12.75,-4.65 12.15,-4.65 12.15,1.05 -12.15,1.05 -12.15,-4.65 -12.75,-4.65 -12.75,-5.5
Mechanical 15:
  lines w0.05: -13.15,-5.6 13.15,-5.6 13.15,2.05 -13.15,2.05 -13.15,-5.6
  lines w0.1: -0.5,0 0.5,0 ; 0,-0.5 0,0.5
3D body: height 0.25, standoff 0, extent -12.75,-5.5 12.75,1.65

## MOLX-54104-4531 [mm] "FPC Connector, 45-Leads, Right Angle, Pitch 0.5 mm, Mated Height 2.0 mm, SMT"
height 2.062
pads (47):
  rect 0.3x1.2 smd: 1(-11,1.5) 2(-10.5,1.5) 3(-10,1.5) 4(-9.5,1.5) 5(-9,1.5) 6(-8.5,1.5) 7(-8,1.5) 8(-7.5,1.5) 9(-7,1.5) 10(-6.5,1.5) 11(-6,1.5) 12(-5.5,1.5) 13(-5,1.5) 14(-4.5,1.5) 15(-4,1.5) 16(-3.5,1.5) 17(-3,1.5) 18(-2.5,1.5) 19(-2,1.5) 20(-1.5,1.5) 21(-1,1.5) 22(-0.5,1.5) 23(0,1.5) 24(0.5,1.5) 25(1,1.5) 26(1.5,1.5) 27(2,1.5) 28(2.5,1.5) 29(3,1.5) 30(3.5,1.5) 31(4,1.5) 32(4.5,1.5) 33(5,1.5) 34(5.5,1.5) 35(6,1.5) 36(6.5,1.5) 37(7,1.5) 38(7.5,1.5) 39(8,1.5) 40(8.5,1.5) 41(9,1.5) 42(9.5,1.5) 43(10,1.5) 44(10.5,1.5) 45(11,1.5)
  rect 1x1 smd: MP1(-13,-1.5) MP2(13,-1.5)
Top Layer:
  region: 11.9,0 13.5,0 13.5,-0.8 14.3,-0.8 14.3,-2.4 11.9,-2.4
  region: -11.9,0 -13.5,0 -13.5,-0.8 -14.3,-0.8 -14.3,-2.4 -11.9,-2.4
Top Overlay:
  circle w0.25: c-11,2.65 r0.125
  lines w0.2: -14,-5.35 14,-5.35 14,-4.5 13.4,-4.5 13.4,-2.8 ; -14,-5.35 -14,-4.5 -13.4,-4.5 -13.4,-2.8 ; -13.4,0.4 -13.4,1.2 -11.55,1.2 ; 11.55,1.2 13.4,1.2 13.4,0.4
Keep-Out Layer:
  region: 11.9,-0.55 11.35,-0.55 11.35,-2.25 11.9,-2.25
  region: -11.35,-0.55 -11.9,-0.55 -11.9,-2.25 -11.35,-2.25
Mechanical 13:
  lines w0.1: -14,-5.35 -14,-4.5 -13.4,-4.5 -13.4,1.2 13.4,1.2 13.4,-4.5 14,-4.5 14,-5.35 -14,-5.35
Mechanical 15:
  lines w0.05: -14.4,-5.45 14.4,-5.45 14.4,2.2 -14.4,2.2 -14.4,-5.45
  lines w0.1: -0.5,0 0.5,0 ; 0,-0.5 0,0.5
3D body: height 0.25, standoff 0, extent -14,-5.35 14,1.8